# Altium footprint library 3.03-USB3.1 Type C-M.2-NGFF-HDMI-PCI-E接口.PcbLib: 40 footprints (part 3 of 3)
Each footprint in its own frame and in the unit in brackets; x right, y up, seen from the top. Pads: shape width x height; smd on the part's side, far side on the other; paste and mask are expansions set on the pad; w line width, h text height; cw(c..) or ccw(c..) is an arc to the next point about the centre after c.
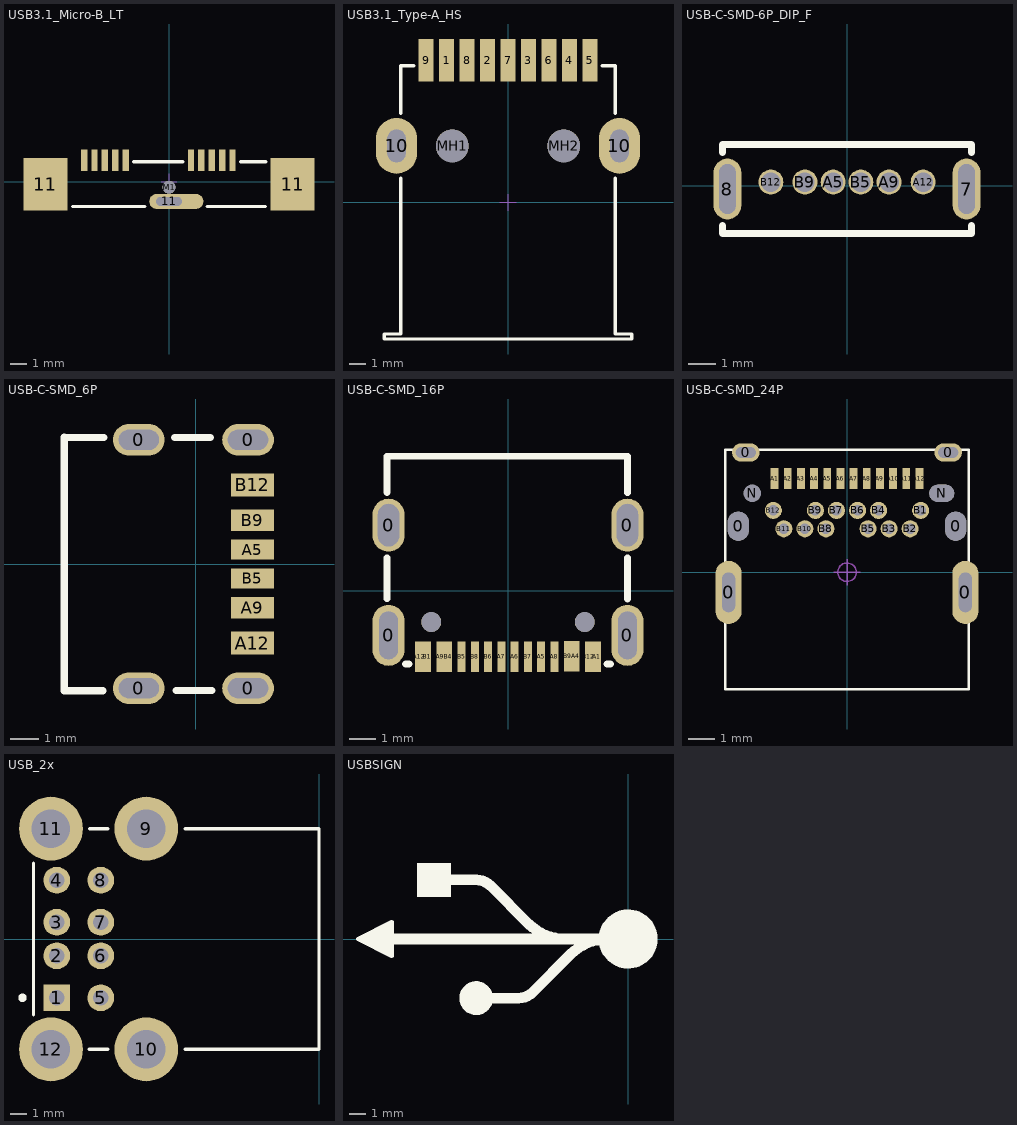
[diagram p2: the footprints below, top view; thin cyan lines are the x and y axes]

## USB3.1_Micro-B_LT [mm] "Micro USB 3.1 Type B LT       封装库来自淘宝ID:黄晶宝石"
height 5.15
pads (14):
  rect 0.4x1.35 smd: 1(3.98,1.34) 2(3.33,1.34) 3(2.68,1.34) 4(2.03,1.34) 5(1.38,1.34) 6(-2.72,1.34) 7(-3.37,1.34) 8(-4.02,1.34) 9(-4.67,1.34) 10(-5.32,1.34)
  rect 2.75x3.3 smd: 11(-7.75,-0.16) 11(7.75,-0.16)
  oval 3.4x0.95 hole 0.55 slot 1.6 at 0 deg copper offset 0.46,0: 11(0,-1.24)
  round 0.8 hole 0.8 unplated: M1(0,-0.35)
Top Overlay:
  lines w0.2: -6.05,-1.56 -1.5,-1.56 ; -2.225,1.24 0.875,1.24 ; 2.4,-1.56 6.05,-1.56 ; 4.475,1.24 6.075,1.24
Mechanical 15:
  lines w0.05: -0.5,0 0.5,0 ; 0,-0.5 0,0.5
3D body "USB3.0 Micro-B_LT.stp": height 5.82, standoff -0.83, extent -8.7,-1.651 8.7,1.849

## USB3.1_Type-A_HS [mm] "USB 3.1 Type A                     封装库来自淘宝ID:黄晶宝石"
height 6.99
pads (13):
  rect 0.9x2.6 smd: 1(-3.75,8.67) 2(-1.25,8.67) 3(1.25,8.67) 4(3.75,8.67) 5(5,8.666) 6(2.5,8.666) 7(0,8.666) 8(-2.5,8.666) 9(-5,8.666)
  oval 2.52x3.4 hole 1.12 slot 2 at 90 deg: 10(-6.8,3.45) 10(6.8,3.45)
  round 2 hole 2 unplated: MH1(-3.4,3.45) MH2(3.4,3.45)
Top Overlay:
  lines w0.2: -6.55,1.47 -6.55,-8.03 -7.55,-8.03 -7.55,-8.33 7.55,-8.33 7.55,-8.03 6.55,-8.03 6.55,1.47 ; -6.55,5.43 -6.55,8.33 -5.75,8.33 ; 5.75,8.33 6.55,8.33 6.55,5.43
Mechanical 15:
  lines w0.05: -0.5,0 0.5,0 ; 0,-0.5 0,0.5
3D body "USB3.0_Type A.stp": height 7.94, standoff -2.3, extent -7.423,-8.215 7.677,9.585

## USB-C-SMD-6P_DIP_F [mm] "封装库来自淘宝ID:黄晶宝石"
pads (8):
  oval 1x2.199 hole 0.6 slot 1.8 at 90 deg: 7(4.32,-0.125) 8(-4.32,-0.125)
  round 0.9 hole 0.7: A5(-0.5,0.125) A9(1.52,0.125) A12(2.75,0.125) B5(0.5,0.125) B9(-1.52,0.125) B12(-2.75,0.125)
Top Overlay:
  lines w0.254: -4.5,-1.445 -4.5,-1.725 4.5,-1.725 4.5,-1.445 ; -4.5,1.195 -4.5,1.475 4.445,1.475 ; 4.5,1.195 4.5,1.475
3D body "typec-6pin.stp": height 6.76, standoff -0.94, extent -4.47,-1.58 4.47,1.603

## USB-C-SMD_6P [mil] "封装库来自淘宝ID:黄晶宝石"
pads (10):
  oval 70.82x43.31 hole 27.56 slot 55.16 at 0 deg: 0(-77.75,-170.08) 0(-77.75,170.08) 0(71.84,-170.08) 0(71.84,170.08)
  rect 59x27.6 smd: A5(77.76,19.7) B5(77.76,-19.7)
  rect 59x29.9 smd: A9(77.76,-59.85) B9(77.76,59.85)
  rect 59x31.5 smd: A12(77.76,-108.25) B12(77.76,108.25)
Top Overlay:
  lines w10: -180.15,-173.6 -126.94,-173.6 ; -180.12,-173.62 -180.12,173.62 ; -180.12,173.23 -125.79,173.23 ; -28.54,173.23 20.27,173.23 ; -26.65,-173.23 22.16,-173.23
3D body "USB_TYPE-C_b.STEP": height 126.77, standoff -37.01, extent -172.36,-175.99 95.35,175.98

## USB-C-SMD_16P [mm] "封装库来自淘宝ID:黄晶宝石"
pads (22):
  oval 1.2x2.3 hole 0.7 slot 1.8 at 90 deg: 0(-4.5,-1.675) 0(4.5,-1.675)
  oval 1.2x2 hole 0.8 slot 1.6 at 90 deg: 0(-4.5,2.475) 0(4.5,2.475)
  rect 0.3x1.15 smd: A1(3.35,-2.473) A4(2.55,-2.471) A5(1.25,-2.475) A6(0.25,-2.475) A7(-0.25,-2.473) A9(-2.55,-2.475) A12(-3.35,-2.475) B1(-3.05,-2.475) B4(-2.25,-2.475) B5(-1.75,-2.475) B6(-0.75,-2.475) B7(0.75,-2.473) B9(2.25,-2.471) B12(3.05,-2.473)
  rect 0.3x1.148 smd: A8(1.75,-2.475) B8(-1.25,-2.475)
  round 0.75 hole 0.75 unplated: ""(-2.89,-1.175) ""(2.89,-1.175)
Top Overlay:
  lines w0.254: -4.557,-0.296 -4.557,1.246 ; -4.557,3.704 -4.557,5.075 4.5,5.075 4.5,3.698 ; -3.856,-2.75 -3.819,-2.75 -3.731,-2.75 ; 3.731,-2.75 3.856,-2.75 ; 4.5,-0.302 4.5,1.252
3D body "USB_TYPE-C_a.STEP": height 3.25, standoff -0.85, extent -4.445,-2.875 4.495,5.025

## USB-C-SMD_24P [mm] "USB 3.2 GEN2 TYPE-C 母座"
pads (32):
  oval 1x2.4 hole 0.5 slot 1.5 at 90 deg: 0(-4.5,-0.765) 0(4.5,-0.765)
  oval 0.8x1.1 hole 0.8 slot 1.1 at 90 deg: 0(-4.13,1.75) 0(4.13,1.75)
  oval 1.05x0.7 hole 0.4 slot 0.75 at 0 deg: 0(-3.845,4.55) 0(3.845,4.55)
  rect 0.3x0.8 smd: A1(-2.75,3.56) A2(-2.25,3.56) A3(-1.75,3.56) A4(-1.25,3.56) A5(-0.75,3.56) A6(-0.25,3.56) A7(0.25,3.56) A8(0.75,3.56) A9(1.25,3.56) A10(1.75,3.56) A11(2.25,3.56) A12(2.75,3.56)
  round 0.65 hole 0.4: B1(2.8,2.35) B2(2.4,1.65) B3(1.6,1.65) B4(1.2,2.35) B5(0.8,1.65) B6(0.4,2.35) B7(-0.4,2.35) B8(-0.8,1.65) B9(-1.2,2.35) B10(-1.6,1.65) B11(-2.4,1.65) B12(-2.8,2.35)
  round 0.65 hole 0.65: N(-3.6,3)
  oval 0.95x0.65 hole 0.65 slot 0.95 at 0 deg: N(3.6,3)
Top Overlay:
  lines w0.1: -4.625,-4.45 -4.625,4.65 4.625,4.65 4.625,-4.45 -4.625,-4.45
Mechanical 15:
  circle w0.05: c0,0 r0.35
  lines w0.05: -0.5,0 0.5,0 ; 0,-0.5 0,0.5
3D body "TYPE-c mu.STEP": height 3.35, standoff -0.9, extent -4.625,-4.45 4.625,4.65

## USB_2x [mm] "USB母座A型"
height 15.51
pads (12):
  rect 1.6x1.6 hole 0.92: 1(-15.61,-3.5)
  round 1.6 hole 0.92: 2(-15.61,-1) 3(-15.61,1) 4(-15.61,3.5) 5(-12.99,-3.5) 6(-12.99,-1) 7(-12.99,1) 8(-12.99,3.5)
  round 3.8 hole 2.3: 9(-10.28,6.57) 10(-10.28,-6.57) 11(-15.96,6.57) 12(-15.96,-6.57)
Top Overlay:
  circle w0.25: c-17.65,-3.5 r0.125
  lines w0.2: -17,-4.51 -17,4.51 ; -13.68,-6.565 -12.58,-6.565 ; -13.66,6.565 -12.58,6.565 ; -7.97,-6.565 0,-6.565 0,6.565 -7.97,6.565

## USBSIGN [mm]
Top Overlay:
  circle w1.524: c0,0 r1.016
  circle w1.016: c-9.144,-3.556 r0.508
  region: -10.668,4.572 -12.7,4.572 -12.7,2.54 -10.668,2.54
  lines w0.254: -15.24,0.025 -14.681,0.483 -14.732,0 -15.469,0.152 -14.656,-0.457 -14.453,0.61 -15.723,0.025 -14.453,-0.635 -14.453,0.787 -15.951,0.025 -14.224,-0.838 ; -16.256,0 -14.224,-1.016 -14.224,1.016 -16.256,0
  lines w0.635: -14.732,0 -8.636,0 0,0 -1.27,0 ccw(c-1.27,-3.066) -3.438,-0.898 -5.737,-3.197 cw(c-6.604,-2.33) -6.604,-3.556 -8.636,-3.556 ; -11.176,3.556 -9.144,3.556 cw(c-9.144,2.33) -8.277,3.197 -5.978,0.898 ccw(c-3.81,3.066) -3.81,0 -3.048,0 ; -8.128,-3.556 -7.874,-3.556 ; -4.318,0 -2.54,0